# Altium footprint library 6-Connectors-6.PcbLib: 117 footprints (part 1 of 8) (continued)
## 3M_2540-6002RB [mm] "40 Contacts - Straight .100\" x .100\" Low Profile Four-Wall Header"
height 10.03
pads (40):
  round 1.6 hole 1: 1(-24.13,-1.27) 2(-24.13,1.27) 3(-21.59,-1.27) 4(-21.59,1.27) 5(-19.05,-1.27) 6(-19.05,1.27) 7(-16.51,-1.27) 8(-16.51,1.27) 9(-13.97,-1.27) 10(-13.97,1.27) 11(-11.43,-1.27) 12(-11.43,1.27) 13(-8.89,-1.27) 14(-8.89,1.27) 15(-6.35,-1.27) 16(-6.35,1.27) 17(-3.81,-1.27) 18(-3.81,1.27) 19(-1.27,-1.27) 20(-1.27,1.27) 21(1.27,-1.27) 22(1.27,1.27) 23(3.81,-1.27) 24(3.81,1.27) 25(6.35,-1.27) 26(6.35,1.27) 27(8.89,-1.27) 28(8.89,1.27) 29(11.43,-1.27) 30(11.43,1.27) 31(13.97,-1.27) 32(13.97,1.27) 33(16.51,-1.27) 34(16.51,1.27) 35(19.05,-1.27) 36(19.05,1.27) 37(21.59,-1.27) 38(21.59,1.27) 39(24.13,-1.27) 40(24.13,1.27)
Top Overlay:
  circle w0.3: c-24.13,-4.699 r0.15
  lines w0.2: -28.042,-1.603 -25.629,-1.603 -25.629,1.603 -28.042,1.603 ; -28.042,-1.524 -28.346,-1.524 -28.346,1.524 -28.042,1.524 ; -24.994,-4.064 -24.13,-3.2 -23.266,-4.064 ; -23.178,3.15 -28.042,3.15 -28.042,-3.2 -3.366,-3.2 ; -23.178,4.064 -23.178,2.159 -22.469,2.159 ; -21.361,-3.835 -21.361,-3.2 ; -19.279,-3.835 -19.279,-3.2 ; -18.987,2.518 -18.987,4.064 ; -18.987,3.15 18.987,3.15 ; -3.366,-4.064 -3.366,-2.438 ; 0.826,-4.064 0.826,-2.438 ; 0.826,-3.2 28.042,-3.2 28.042,3.15 25.4,3.15 ; 18.987,2.518 18.987,4.064 ; 21.819,-3.835 21.819,-3.2 ; 22.469,2.159 23.178,2.159 23.178,4.064 ; 23.901,-3.835 23.901,-3.2 ; 28.042,-1.603 25.629,-1.603 25.629,1.603 28.042,1.603 ; 28.042,-1.524 28.346,-1.524 28.346,1.524 28.042,1.524 ; -29.058,-4.064 -22.352,-4.064 -22.352,-3.835 -18.288,-3.835 -18.288,-4.064 20.828,-4.064 20.828,-3.835 24.892,-3.835 24.892,-4.064 29.058,-4.064 29.058,4.064 28.397,4.064 ccw(c27.94,4.064) 27.483,4.064 -0.813,4.064 ccw(c-1.27,4.064) -1.727,4.064 -27.483,4.064 ccw(c-27.94,4.064) -28.397,4.064 -29.058,4.064 -29.058,-4.064
  text "40" at 23.495,2.667 h1.02
Mechanical 14:
  lines w0.1: -28.042,-1.603 -25.629,-1.603 -25.629,1.603 -28.042,1.603 ; -28.042,-1.524 -28.346,-1.524 -28.346,1.524 -28.042,1.524 ; -24.994,-4.064 -24.13,-3.2 -23.266,-4.064 ; -23.178,3.15 -28.042,3.15 -28.042,-3.2 -3.366,-3.2 ; -23.178,4.064 -23.178,2.159 -18.987,2.159 -18.987,4.064 ; -21.361,-3.835 -21.361,-3.2 ; -19.279,-3.835 -19.279,-3.2 ; -18.987,3.15 18.987,3.15 ; -3.366,-4.064 -3.366,-2.159 0.826,-2.159 0.826,-4.064 ; 0.826,-3.2 28.042,-3.2 28.042,3.15 25.4,3.15 ; 18.987,4.064 18.987,2.159 23.178,2.159 23.178,4.064 ; 21.819,-3.835 21.819,-3.2 ; 23.901,-3.835 23.901,-3.2 ; 28.042,-1.603 25.629,-1.603 25.629,1.603 28.042,1.603 ; 28.042,-1.524 28.346,-1.524 28.346,1.524 28.042,1.524 ; -29.058,-4.064 -22.352,-4.064 -22.352,-3.835 -18.288,-3.835 -18.288,-4.064 20.828,-4.064 20.828,-3.835 24.892,-3.835 24.892,-4.064 29.058,-4.064 29.058,4.064 28.397,4.064 ccw(c27.94,4.064) 27.483,4.064 -0.813,4.064 ccw(c-1.27,4.064) -1.727,4.064 -27.483,4.064 ccw(c-27.94,4.064) -28.397,4.064 -29.058,4.064 -29.058,-4.064
  text "40" at 23.495,2.667 h1.02
3D body "3M_2540-6002RB.stp": height 9.65, standoff -2.59, extent -29.058,-4.064 29.058,4.572

## 3M_2550-6002RB [mm] "50 Contacts - Straight .100\" x .100\" Low Profile Four-Wall Header"
height 10.03
pads (50):
  round 1.6 hole 1: 1(-30.48,-1.27) 2(-30.48,1.27) 3(-27.94,-1.27) 4(-27.94,1.27) 5(-25.4,-1.27) 6(-25.4,1.27) 7(-22.86,-1.27) 8(-22.86,1.27) 9(-20.32,-1.27) 10(-20.32,1.27) 11(-17.78,-1.27) 12(-17.78,1.27) 13(-15.24,-1.27) 14(-15.24,1.27) 15(-12.7,-1.27) 16(-12.7,1.27) 17(-10.16,-1.27) 18(-10.16,1.27) 19(-7.62,-1.27) 20(-7.62,1.27) 21(-5.08,-1.27) 22(-5.08,1.27) 23(-2.54,-1.27) 24(-2.54,1.27) 25(0,-1.27) 26(0,1.27) 27(2.54,-1.27) 28(2.54,1.27) 29(5.08,-1.27) 30(5.08,1.27) 31(7.62,-1.27) 32(7.62,1.27) 33(10.16,-1.27) 34(10.16,1.27) 35(12.7,-1.27) 36(12.7,1.27) 37(15.24,-1.27) 38(15.24,1.27) 39(17.78,-1.27) 40(17.78,1.27) 41(20.32,-1.27) 42(20.32,1.27) 43(22.86,-1.27) 44(22.86,1.27) 45(25.4,-1.27) 46(25.4,1.27) 47(27.94,-1.27) 48(27.94,1.27) 49(30.48,-1.27) 50(30.48,1.27)
Top Overlay:
  circle w0.3: c-30.48,-4.699 r0.15
  lines w0.2: -34.392,-1.603 -31.979,-1.603 -31.979,1.603 -34.392,1.603 ; -34.392,-1.524 -34.696,-1.524 -34.696,1.524 -34.392,1.524 ; -31.344,-4.064 -30.48,-3.2 -29.616,-4.064 ; -29.528,3.15 -34.392,3.15 -34.392,-3.2 -2.096,-3.2 ; -29.528,4.064 -29.528,2.159 -28.819,2.159 ; -27.711,-3.835 -27.711,-3.2 ; -25.629,-3.835 -25.629,-3.2 ; -25.337,2.518 -25.337,4.064 ; -25.337,3.15 25.337,3.15 ; -2.096,-4.064 -2.096,-2.438 ; 2.095,-4.064 2.095,-2.438 ; 2.095,-3.2 34.392,-3.2 34.392,3.15 31.75,3.15 ; 25.337,2.518 25.337,4.064 ; 28.169,-3.835 28.169,-3.2 ; 28.819,2.159 29.528,2.159 29.528,4.064 ; 30.251,-3.835 30.251,-3.2 ; 34.392,-1.603 31.979,-1.603 31.979,1.603 34.392,1.603 ; 34.392,-1.524 34.696,-1.524 34.696,1.524 34.392,1.524 ; -35.408,-4.064 -35.408,4.064 -34.747,4.064 cw(c-34.29,4.064) -33.833,4.064 -0.457,4.064 cw(c0,4.064) 0.457,4.064 33.833,4.064 cw(c34.29,4.064) 34.747,4.064 35.408,4.064 35.408,-4.064 31.242,-4.064 31.242,-3.835 27.178,-3.835 27.178,-4.064 -24.638,-4.064 -24.638,-3.835 -28.702,-3.835 -28.702,-4.064 -35.408,-4.064
  text "50" at 29.845,2.667 h1.02
Mechanical 14:
  lines w0.1: -34.392,-1.603 -31.979,-1.603 -31.979,1.603 -34.392,1.603 ; -34.392,-1.524 -34.696,-1.524 -34.696,1.524 -34.392,1.524 ; -31.344,-4.064 -30.48,-3.2 -29.616,-4.064 ; -29.528,3.15 -34.392,3.15 -34.392,-3.2 -2.096,-3.2 ; -29.528,4.064 -29.528,2.159 -25.337,2.159 -25.337,4.064 ; -27.711,-3.835 -27.711,-3.2 ; -25.629,-3.835 -25.629,-3.2 ; -25.337,3.15 25.337,3.15 ; -2.096,-4.064 -2.096,-2.159 2.095,-2.159 2.095,-4.064 ; 2.095,-3.2 34.392,-3.2 34.392,3.15 31.75,3.15 ; 25.337,4.064 25.337,2.159 29.528,2.159 29.528,4.064 ; 28.169,-3.835 28.169,-3.2 ; 30.251,-3.835 30.251,-3.2 ; 34.392,-1.603 31.979,-1.603 31.979,1.603 34.392,1.603 ; 34.392,-1.524 34.696,-1.524 34.696,1.524 34.392,1.524 ; -35.408,-4.064 -35.408,4.064 -34.747,4.064 cw(c-34.29,4.064) -33.833,4.064 -0.457,4.064 cw(c0,4.064) 0.457,4.064 33.833,4.064 cw(c34.29,4.064) 34.747,4.064 35.408,4.064 35.408,-4.064 31.242,-4.064 31.242,-3.835 27.178,-3.835 27.178,-4.064 -24.638,-4.064 -24.638,-3.835 -28.702,-3.835 -28.702,-4.064 -35.408,-4.064
  text "50" at 29.845,2.667 h1.02
3D body "3M_2550-6002RB.stp": height 9.65, standoff -2.59, extent -35.408,-4.064 35.408,4.572

## 3M_2560-6002RB [mm] "60 Contacts - Straight .100\" x .100\" Low Profile Four-Wall Header"
height 10.03
pads (60):
  round 1.6 hole 1: 1(-36.83,-1.27) 2(-36.83,1.27) 3(-34.29,-1.27) 4(-34.29,1.27) 5(-31.75,-1.27) 6(-31.75,1.27) 7(-29.21,-1.27) 8(-29.21,1.27) 9(-26.67,-1.27) 10(-26.67,1.27) 11(-24.13,-1.27) 12(-24.13,1.27) 13(-21.59,-1.27) 14(-21.59,1.27) 15(-19.05,-1.27) 16(-19.05,1.27) 17(-16.51,-1.27) 18(-16.51,1.27) 19(-13.97,-1.27) 20(-13.97,1.27) 21(-11.43,-1.27) 22(-11.43,1.27) 23(-8.89,-1.27) 24(-8.89,1.27) 25(-6.35,-1.27) 26(-6.35,1.27) 27(-3.81,-1.27) 28(-3.81,1.27) 29(-1.27,-1.27) 30(-1.27,1.27) 31(1.27,-1.27) 32(1.27,1.27) 33(3.81,-1.27) 34(3.81,1.27) 35(6.35,-1.27) 36(6.35,1.27) 37(8.89,-1.27) 38(8.89,1.27) 39(11.43,-1.27) 40(11.43,1.27) 41(13.97,-1.27) 42(13.97,1.27) 43(16.51,-1.27) 44(16.51,1.27) 45(19.05,-1.27) 46(19.05,1.27) 47(21.59,-1.27) 48(21.59,1.27) 49(24.13,-1.27) 50(24.13,1.27) 51(26.67,-1.27) 52(26.67,1.27) 53(29.21,-1.27) 54(29.21,1.27) 55(31.75,-1.27) 56(31.75,1.27) 57(34.29,-1.27) 58(34.29,1.27) 59(36.83,-1.27) 60(36.83,1.27)
Top Overlay:
  circle w0.3: c-36.83,-4.699 r0.15
  lines w0.2: -40.742,-1.603 -38.329,-1.603 -38.329,1.603 -40.742,1.603 ; -40.742,-1.524 -41.046,-1.524 -41.046,1.524 -40.742,1.524 ; -37.694,-4.064 -36.83,-3.2 -35.966,-4.064 ; -35.878,3.15 -40.742,3.15 -40.742,-3.2 -3.366,-3.2 ; -35.878,4.064 -35.878,2.159 -35.169,2.159 ; -34.061,-3.835 -34.061,-3.2 ; -31.979,-3.835 -31.979,-3.2 ; -31.687,2.518 -31.687,4.064 ; -31.687,3.15 31.687,3.15 ; -3.366,-4.064 -3.366,-2.438 ; 0.826,-4.064 0.826,-2.438 ; 0.826,-3.2 40.742,-3.2 40.742,3.15 38.1,3.15 ; 31.687,2.518 31.687,4.064 ; 34.519,-3.835 34.519,-3.2 ; 35.169,2.159 35.878,2.159 35.878,4.064 ; 36.601,-3.835 36.601,-3.2 ; 40.742,-1.603 38.329,-1.603 38.329,1.603 40.742,1.603 ; 40.742,-1.524 41.046,-1.524 41.046,1.524 40.742,1.524 ; -41.758,-4.064 -35.052,-4.064 -35.052,-3.835 -30.988,-3.835 -30.988,-4.064 33.528,-4.064 33.528,-3.835 37.592,-3.835 37.592,-4.064 41.758,-4.064 41.758,4.064 41.097,4.064 ccw(c40.64,4.064) 40.183,4.064 -0.813,4.064 ccw(c-1.27,4.064) -1.727,4.064 -40.183,4.064 ccw(c-40.64,4.064) -41.097,4.064 -41.758,4.064 -41.758,-4.064
  text "60" at 36.195,2.667 h1.02
Mechanical 14:
  lines w0.1: -40.742,-1.603 -38.329,-1.603 -38.329,1.603 -40.742,1.603 ; -40.742,-1.524 -41.046,-1.524 -41.046,1.524 -40.742,1.524 ; -37.694,-4.064 -36.83,-3.2 -35.966,-4.064 ; -35.878,3.15 -40.742,3.15 -40.742,-3.2 -3.366,-3.2 ; -35.878,4.064 -35.878,2.159 -31.687,2.159 -31.687,4.064 ; -34.061,-3.835 -34.061,-3.2 ; -31.979,-3.835 -31.979,-3.2 ; -31.687,3.15 31.687,3.15 ; -3.366,-4.064 -3.366,-2.159 0.826,-2.159 0.826,-4.064 ; 0.826,-3.2 40.742,-3.2 40.742,3.15 38.1,3.15 ; 31.687,4.064 31.687,2.159 35.878,2.159 35.878,4.064 ; 34.519,-3.835 34.519,-3.2 ; 36.601,-3.835 36.601,-3.2 ; 40.742,-1.603 38.329,-1.603 38.329,1.603 40.742,1.603 ; 40.742,-1.524 41.046,-1.524 41.046,1.524 40.742,1.524 ; -41.758,-4.064 -35.052,-4.064 -35.052,-3.835 -30.988,-3.835 -30.988,-4.064 33.528,-4.064 33.528,-3.835 37.592,-3.835 37.592,-4.064 41.758,-4.064 41.758,4.064 41.097,4.064 ccw(c40.64,4.064) 40.183,4.064 -0.813,4.064 ccw(c-1.27,4.064) -1.727,4.064 -40.183,4.064 ccw(c-40.64,4.064) -41.097,4.064 -41.758,4.064 -41.758,-4.064
  text "60" at 36.195,2.667 h1.02
3D body "3M_2560-6002RB.stp": height 9.65, standoff -2.59, extent -41.758,-4.064 41.758,4.572

## 3M_2564-6002RB [mm] "64 Contacts - Straight .100\" x .100\" Low Profile Four-Wall Header"
height 10.03
pads (64):
  round 1.6 hole 1: 1(-39.37,-1.27) 2(-39.37,1.27) 3(-36.83,-1.27) 4(-36.83,1.27) 5(-34.29,-1.27) 6(-34.29,1.27) 7(-31.75,-1.27) 8(-31.75,1.27) 9(-29.21,-1.27) 10(-29.21,1.27) 11(-26.67,-1.27) 12(-26.67,1.27) 13(-24.13,-1.27) 14(-24.13,1.27) 15(-21.59,-1.27) 16(-21.59,1.27) 17(-19.05,-1.27) 18(-19.05,1.27) 19(-16.51,-1.27) 20(-16.51,1.27) 21(-13.97,-1.27) 22(-13.97,1.27) 23(-11.43,-1.27) 24(-11.43,1.27) 25(-8.89,-1.27) 26(-8.89,1.27) 27(-6.35,-1.27) 28(-6.35,1.27) 29(-3.81,-1.27) 30(-3.81,1.27) 31(-1.27,-1.27) 32(-1.27,1.27) 33(1.27,-1.27) 34(1.27,1.27) 35(3.81,-1.27) 36(3.81,1.27) 37(6.35,-1.27) 38(6.35,1.27) 39(8.89,-1.27) 40(8.89,1.27) 41(11.43,-1.27) 42(11.43,1.27) 43(13.97,-1.27) 44(13.97,1.27) 45(16.51,-1.27) 46(16.51,1.27) 47(19.05,-1.27) 48(19.05,1.27) 49(21.59,-1.27) 50(21.59,1.27) 51(24.13,-1.27) 52(24.13,1.27) 53(26.67,-1.27) 54(26.67,1.27) 55(29.21,-1.27) 56(29.21,1.27) 57(31.75,-1.27) 58(31.75,1.27) 59(34.29,-1.27) 60(34.29,1.27) 61(36.83,-1.27) 62(36.83,1.27) 63(39.37,-1.27) 64(39.37,1.27)
Top Overlay:
  circle w0.3: c-39.37,-4.699 r0.15
  lines w0.2: -43.282,-1.603 -40.869,-1.603 -40.869,1.603 -43.282,1.603 ; -43.282,-1.524 -43.586,-1.524 -43.586,1.524 -43.282,1.524 ; -40.234,-4.064 -39.37,-3.2 -38.506,-4.064 ; -38.418,3.15 -43.282,3.15 -43.282,-3.2 -3.366,-3.2 ; -38.418,4.064 -38.418,2.159 -37.709,2.159 ; -36.601,-3.835 -36.601,-3.2 ; -34.519,-3.835 -34.519,-3.2 ; -34.227,2.518 -34.227,4.064 ; -34.227,3.15 34.227,3.15 ; -3.366,-4.064 -3.366,-2.438 ; 0.826,-4.064 0.826,-2.438 ; 0.826,-3.2 43.282,-3.2 43.282,3.15 40.64,3.15 ; 34.227,2.518 34.227,4.064 ; 37.059,-3.835 37.059,-3.2 ; 37.709,2.159 38.418,2.159 38.418,4.064 ; 39.141,-3.835 39.141,-3.2 ; 43.282,-1.603 40.869,-1.603 40.869,1.603 43.282,1.603 ; 43.282,-1.524 43.586,-1.524 43.586,1.524 43.282,1.524 ; -44.298,-4.064 -37.592,-4.064 -37.592,-3.835 -33.528,-3.835 -33.528,-4.064 36.068,-4.064 36.068,-3.835 40.132,-3.835 40.132,-4.064 44.298,-4.064 44.298,4.064 43.637,4.064 ccw(c43.18,4.064) 42.723,4.064 -0.813,4.064 ccw(c-1.27,4.064) -1.727,4.064 -42.723,4.064 ccw(c-43.18,4.064) -43.637,4.064 -44.298,4.064 -44.298,-4.064
  text "64" at 38.735,2.667 h1.02
Mechanical 14:
  lines w0.1: -43.282,-1.603 -40.869,-1.603 -40.869,1.603 -43.282,1.603 ; -43.282,-1.524 -43.586,-1.524 -43.586,1.524 -43.282,1.524 ; -40.234,-4.064 -39.37,-3.2 -38.506,-4.064 ; -38.418,3.15 -43.282,3.15 -43.282,-3.2 -3.366,-3.2 ; -38.418,4.064 -38.418,2.159 -34.227,2.159 -34.227,4.064 ; -36.601,-3.835 -36.601,-3.2 ; -34.519,-3.835 -34.519,-3.2 ; -34.227,3.15 34.227,3.15 ; -3.366,-4.064 -3.366,-2.159 0.826,-2.159 0.826,-4.064 ; 0.826,-3.2 43.282,-3.2 43.282,3.15 40.64,3.15 ; 34.227,4.064 34.227,2.159 38.418,2.159 38.418,4.064 ; 37.059,-3.835 37.059,-3.2 ; 39.141,-3.835 39.141,-3.2 ; 43.282,-1.603 40.869,-1.603 40.869,1.603 43.282,1.603 ; 43.282,-1.524 43.586,-1.524 43.586,1.524 43.282,1.524 ; -44.298,-4.064 -37.592,-4.064 -37.592,-3.835 -33.528,-3.835 -33.528,-4.064 36.068,-4.064 36.068,-3.835 40.132,-3.835 40.132,-4.064 44.298,-4.064 44.298,4.064 43.637,4.064 ccw(c43.18,4.064) 42.723,4.064 -0.813,4.064 ccw(c-1.27,4.064) -1.727,4.064 -42.723,4.064 ccw(c-43.18,4.064) -43.637,4.064 -44.298,4.064 -44.298,-4.064
  text "64" at 38.735,2.667 h1.02
3D body "3M_2564-6002RB.stp": height 9.65, standoff -2.59, extent -44.298,-4.064 44.298,4.572

## 3M_9120-4500PL [mm] "20 Contacts - Straight .100\" x .100\" Polarized Boardmount Socket, 9100 Series"
height 9
pads (20):
  round 1.6 hole 0.9: 1(11.43,-1.27) 2(11.43,1.27) 3(8.89,-1.27) 4(8.89,1.27) 5(6.35,-1.27) 6(6.35,1.27) 7(3.81,-1.27) 8(3.81,1.27) 9(1.27,-1.27) 10(1.27,1.27) 11(-1.27,-1.27) 12(-1.27,1.27) 13(-3.81,-1.27) 14(-3.81,1.27) 15(-6.35,-1.27) 16(-6.35,1.27) 17(-8.89,-1.27) 18(-8.89,1.27) 19(-11.43,-1.27) 20(-11.43,1.27)
Top Overlay:
  circle w0.3: c11.43,-3.556 r0.15
  lines w0.2: -1.7,-3.05 -1.7,-4.05 1.7,-4.05 1.7,-3.05 ; -14.95,-2.05 ccw(c-13.95,-2.05) -13.95,-3.05 13.95,-3.05 ccw(c13.95,-2.05) 14.95,-2.05 14.95,-1.27 13.95,-1.27 13.95,1.27 14.95,1.27 14.95,2.05 ccw(c13.95,2.05) 13.95,3.05 -13.95,3.05 ccw(c-13.95,2.05) -14.95,2.05 -14.95,1.27 -13.95,1.27 -13.95,-1.27 -14.95,-1.27 -14.95,-2.05 ; 10.566,-3.05 12.294,-3.05 11.43,-2.186 10.566,-3.05
Mechanical 8:
  lines w0.1: -12.43,-1.27 -11.43,-1.27 ; -12.43,1.27 -11.43,1.27 ; -11.43,-2.27 -11.43,-1.27 ; -11.43,-0.27 -11.43,-1.27 ; -11.43,0.27 -11.43,1.27 ; -11.43,2.27 -11.43,1.27 ; -10.43,-1.27 -11.43,-1.27 ; -10.43,1.27 -11.43,1.27 ; -9.89,-1.27 -8.89,-1.27 ; -9.89,1.27 -8.89,1.27 ; -8.89,-2.27 -8.89,-1.27 ; -8.89,-0.27 -8.89,-1.27 ; -8.89,0.27 -8.89,1.27 ; -8.89,2.27 -8.89,1.27 ; -7.89,-1.27 -8.89,-1.27 ; -7.89,1.27 -8.89,1.27 ; -7.35,-1.27 -6.35,-1.27 ; -7.35,1.27 -6.35,1.27 ; -6.35,-2.27 -6.35,-1.27 ; -6.35,-0.27 -6.35,-1.27 ; -6.35,0.27 -6.35,1.27 ; -6.35,2.27 -6.35,1.27 ; -5.35,-1.27 -6.35,-1.27 ; -5.35,1.27 -6.35,1.27 ; -4.81,-1.27 -3.81,-1.27 ; -4.81,1.27 -3.81,1.27 ; -3.81,-2.27 -3.81,-1.27 ; -3.81,-0.27 -3.81,-1.27 ; -3.81,0.27 -3.81,1.27 ; -3.81,2.27 -3.81,1.27 ; -2.81,-1.27 -3.81,-1.27 ; -2.81,1.27 -3.81,1.27 ; -2.27,-1.27 -1.27,-1.27 ; -2.27,1.27 -1.27,1.27 ; -1.27,-2.27 -1.27,-1.27 ; -1.27,-0.27 -1.27,-1.27 ; -1.27,0.27 -1.27,1.27 ; -1.27,2.27 -1.27,1.27 ; -1,0 0,0 ; -0.27,-1.27 -1.27,-1.27 ; -0.27,1.27 -1.27,1.27 ; 0,-1 0,0 ; 0,1 0,0 ; 0.27,-1.27 1.27,-1.27 ; 0.27,1.27 1.27,1.27 ; 1,0 0,0 ; 1.27,-2.27 1.27,-1.27 ; 1.27,-0.27 1.27,-1.27 ; 1.27,0.27 1.27,1.27 ; 1.27,2.27 1.27,1.27 ; 2.27,-1.27 1.27,-1.27 ; 2.27,1.27 1.27,1.27 ; 2.81,-1.27 3.81,-1.27 ; 2.81,1.27 3.81,1.27 ; 3.81,-2.27 3.81,-1.27 ; 3.81,-0.27 3.81,-1.27 ; 3.81,0.27 3.81,1.27 ; 3.81,2.27 3.81,1.27 ; 4.81,-1.27 3.81,-1.27 ; 4.81,1.27 3.81,1.27 ; 5.35,-1.27 6.35,-1.27 ; 5.35,1.27 6.35,1.27 ; 6.35,-2.27 6.35,-1.27 ; 6.35,-0.27 6.35,-1.27 ; 6.35,0.27 6.35,1.27 ; 6.35,2.27 6.35,1.27 ; 7.35,-1.27 6.35,-1.27 ; 7.35,1.27 6.35,1.27 ; 7.89,-1.27 8.89,-1.27 ; 7.89,1.27 8.89,1.27 ; 8.89,-2.27 8.89,-1.27 ; 8.89,-0.27 8.89,-1.27 ; 8.89,0.27 8.89,1.27 ; 8.89,2.27 8.89,1.27 ; 9.89,-1.27 8.89,-1.27 ; 9.89,1.27 8.89,1.27 ; 10.43,-1.27 11.43,-1.27 ; 10.43,1.27 11.43,1.27 ; 11.43,-2.27 11.43,-1.27 ; 11.43,-0.27 11.43,-1.27 ; 11.43,0.27 11.43,1.27 ; 11.43,2.27 11.43,1.27 ; 12.43,-1.27 11.43,-1.27 ; 12.43,1.27 11.43,1.27
Mechanical 14:
  circle w0.3: c11.43,-3.556 r0.15
  lines w0.1: 10.566,-3.05 11.43,-2.186 12.294,-3.05 ; -14.95,-2.05 ccw(c-13.95,-2.05) -13.95,-3.05 13.95,-3.05 ccw(c13.95,-2.05) 14.95,-2.05 14.95,-1.27 13.95,-1.27 13.95,1.27 14.95,1.27 14.95,2.05 ccw(c13.95,2.05) 13.95,3.05 -13.95,3.05 ccw(c-13.95,2.05) -14.95,2.05 -14.95,1.27 -13.95,1.27 -13.95,-1.27 -14.95,-1.27 ; -14.95,-2.05 -14.95,-1.27 ; -14.95,-2.05 -14.95,-1.27 ; -1.7,-4.05 1.7,-4.05 1.7,-3.05 -1.7,-3.05 -1.7,-4.05
3D body "3M_9120-4500PL.stp": height 9, standoff -2.8, extent -14.95,-4.05 14.95,3.05

## 3M_9126-4500PL [mm] "26 Contacts - Straight .100\" x .100\" Polarized Boardmount Socket, 9100 Series"
height 9
pads (26):
  round 1.6 hole 0.9: 1(15.24,-1.27) 2(15.24,1.27) 3(12.7,-1.27) 4(12.7,1.27) 5(10.16,-1.27) 6(10.16,1.27) 7(7.62,-1.27) 8(7.62,1.27) 9(5.08,-1.27) 10(5.08,1.27) 11(2.54,-1.27) 12(2.54,1.27) 13(0,-1.27) 14(0,1.27) 15(-2.54,-1.27) 16(-2.54,1.27) 17(-5.08,-1.27) 18(-5.08,1.27) 19(-7.62,-1.27) 20(-7.62,1.27) 21(-10.16,-1.27) 22(-10.16,1.27) 23(-12.7,-1.27) 24(-12.7,1.27) 25(-15.24,-1.27) 26(-15.24,1.27)
Top Overlay:
  lines w0.2: -1.7,-3.05 -1.7,-4.05 1.7,-4.05 1.7,-3.05 ; -18.76,-2.05 ccw(c-17.76,-2.05) -17.76,-3.05 17.74,-3.05 ccw(c17.74,-2.05) 18.74,-2.05 18.74,-1.27 17.74,-1.27 17.74,1.27 18.74,1.27 18.74,2.05 ccw(c17.74,2.05) 17.74,3.05 -17.76,3.05 ccw(c-17.76,2.05) -18.76,2.05 -18.76,1.27 -17.76,1.27 -17.76,-1.27 -18.76,-1.27 ; -18.76,-2.05 -18.76,-1.27 ; -18.76,-2.05 -18.76,-1.27
Mechanical 8:
  lines w0.1: -16.24,-1.27 -15.24,-1.27 ; -16.24,1.27 -15.24,1.27 ; -15.24,-2.27 -15.24,-1.27 ; -15.24,-0.27 -15.24,-1.27 ; -15.24,0.27 -15.24,1.27 ; -15.24,2.27 -15.24,1.27 ; -14.24,-1.27 -15.24,-1.27 ; -14.24,1.27 -15.24,1.27 ; -13.7,-1.27 -12.7,-1.27 ; -13.7,1.27 -12.7,1.27 ; -12.7,-2.27 -12.7,-1.27 ; -12.7,-0.27 -12.7,-1.27 ; -12.7,0.27 -12.7,1.27 ; -12.7,2.27 -12.7,1.27 ; -11.7,-1.27 -12.7,-1.27 ; -11.7,1.27 -12.7,1.27 ; -11.16,-1.27 -10.16,-1.27 ; -11.16,1.27 -10.16,1.27 ; -10.16,-2.27 -10.16,-1.27 ; -10.16,-0.27 -10.16,-1.27 ; -10.16,0.27 -10.16,1.27 ; -10.16,2.27 -10.16,1.27 ; -9.16,-1.27 -10.16,-1.27 ; -9.16,1.27 -10.16,1.27 ; -8.62,-1.27 -7.62,-1.27 ; -8.62,1.27 -7.62,1.27 ; -7.62,-2.27 -7.62,-1.27 ; -7.62,-0.27 -7.62,-1.27 ; -7.62,0.27 -7.62,1.27 ; -7.62,2.27 -7.62,1.27 ; -6.62,-1.27 -7.62,-1.27 ; -6.62,1.27 -7.62,1.27 ; -6.08,-1.27 -5.08,-1.27 ; -6.08,1.27 -5.08,1.27 ; -5.08,-2.27 -5.08,-1.27 ; -5.08,-0.27 -5.08,-1.27 ; -5.08,0.27 -5.08,1.27 ; -5.08,2.27 -5.08,1.27 ; -4.08,-1.27 -5.08,-1.27 ; -4.08,1.27 -5.08,1.27 ; -3.54,-1.27 -2.54,-1.27 ; -3.54,1.27 -2.54,1.27 ; -2.54,-2.27 -2.54,-1.27 ; -2.54,-0.27 -2.54,-1.27 ; -2.54,0.27 -2.54,1.27 ; -2.54,2.27 -2.54,1.27 ; -1.54,-1.27 -2.54,-1.27 ; -1.54,1.27 -2.54,1.27 ; -1,-1.27 0,-1.27 ; -1,0 0,0 ; -1,1.27 0,1.27 ; 0,-2.27 0,-1.27 ; 0,-1 0,0 ; 0,-0.27 0,-1.27 ; 0,0.27 0,1.27 ; 0,1 0,0 ; 0,2.27 0,1.27 ; 1,-1.27 0,-1.27 ; 1,0 0,0 ; 1,1.27 0,1.27 ; 1.54,-1.27 2.54,-1.27 ; 1.54,1.27 2.54,1.27 ; 2.54,-2.27 2.54,-1.27 ; 2.54,-0.27 2.54,-1.27 ; 2.54,0.27 2.54,1.27 ; 2.54,2.27 2.54,1.27 ; 3.54,-1.27 2.54,-1.27 ; 3.54,1.27 2.54,1.27 ; 4.08,-1.27 5.08,-1.27 ; 4.08,1.27 5.08,1.27 ; 5.08,-2.27 5.08,-1.27 ; 5.08,-0.27 5.08,-1.27 ; 5.08,0.27 5.08,1.27 ; 5.08,2.27 5.08,1.27 ; 6.08,-1.27 5.08,-1.27 ; 6.08,1.27 5.08,1.27 ; 6.62,-1.27 7.62,-1.27 ; 6.62,1.27 7.62,1.27 ; 7.62,-2.27 7.62,-1.27 ; 7.62,-0.27 7.62,-1.27 ; 7.62,0.27 7.62,1.27 ; 7.62,2.27 7.62,1.27 ; 8.62,-1.27 7.62,-1.27 ; 8.62,1.27 7.62,1.27 ; 9.16,-1.27 10.16,-1.27 ; 9.16,1.27 10.16,1.27 ; 10.16,-2.27 10.16,-1.27 ; 10.16,-0.27 10.16,-1.27 ; 10.16,0.27 10.16,1.27 ; 10.16,2.27 10.16,1.27 ; 11.16,-1.27 10.16,-1.27 ; 11.16,1.27 10.16,1.27 ; 11.7,-1.27 12.7,-1.27 ; 11.7,1.27 12.7,1.27 ; 12.7,-2.27 12.7,-1.27 ; 12.7,-0.27 12.7,-1.27 ; 12.7,0.27 12.7,1.27 ; 12.7,2.27 12.7,1.27 ; 13.7,-1.27 12.7,-1.27 ; 13.7,1.27 12.7,1.27 ; 14.24,-1.27 15.24,-1.27 ; 14.24,1.27 15.24,1.27 ; 15.24,-2.27 15.24,-1.27 ; 15.24,-0.27 15.24,-1.27 ; 15.24,0.27 15.24,1.27 ; 15.24,2.27 15.24,1.27 ; 16.24,-1.27 15.24,-1.27 ; 16.24,1.27 15.24,1.27
Mechanical 14:
  lines w0.1: -1.7,-3.05 -1.7,-4.05 1.7,-4.05 1.7,-3.05 ; -18.76,-2.05 ccw(c-17.76,-2.05) -17.76,-3.05 17.74,-3.05 ccw(c17.74,-2.05) 18.74,-2.05 18.74,-1.27 17.74,-1.27 17.74,1.27 18.74,1.27 18.74,2.05 ccw(c17.74,2.05) 17.74,3.05 -17.76,3.05 ccw(c-17.76,2.05) -18.76,2.05 -18.76,1.27 -17.76,1.27 -17.76,-1.27 -18.76,-1.27 ; -18.76,-2.05 -18.76,-1.27 ; -18.76,-2.05 -18.76,-1.27
3D body "3M_9126-4500PL.stp": height 9, standoff -2.8, extent -18.76,-4.05 18.74,3.05

## 3M_9134-4500PL [mm] "34 Contacts - Straight .100\" x .100\" Polarized Boardmount Socket, 9100 Series"
height 9
pads (34):
  round 1.6 hole 0.9: 1(20.32,-1.27) 2(20.32,1.27) 3(17.78,-1.27) 4(17.78,1.27) 5(15.24,-1.27) 6(15.24,1.27) 7(12.7,-1.27) 8(12.7,1.27) 9(10.16,-1.27) 10(10.16,1.27) 11(7.62,-1.27) 12(7.62,1.27) 13(5.08,-1.27) 14(5.08,1.27) 15(2.54,-1.27) 16(2.54,1.27) 17(0,-1.27) 18(0,1.27) 19(-2.54,-1.27) 20(-2.54,1.27) 21(-5.08,-1.27) 22(-5.08,1.27) 23(-7.62,-1.27) 24(-7.62,1.27) 25(-10.16,-1.27) 26(-10.16,1.27) 27(-12.7,-1.27) 28(-12.7,1.27) 29(-15.24,-1.27) 30(-15.24,1.27) 31(-17.78,-1.27) 32(-17.78,1.27) 33(-20.32,-1.27) 34(-20.32,1.27)
Top Overlay:
  lines w0.2: -1.7,-3.05 -1.7,-4.05 1.7,-4.05 1.7,-3.05 ; -23.86,-2.05 ccw(c-22.86,-2.05) -22.86,-3.05 22.84,-3.05 ccw(c22.84,-2.05) 23.84,-2.05 23.84,-1.27 22.84,-1.27 22.84,1.27 23.84,1.27 23.84,2.05 ccw(c22.84,2.05) 22.84,3.05 -22.86,3.05 ccw(c-22.86,2.05) -23.86,2.05 -23.86,1.27 -22.86,1.27 -22.86,-1.27 -23.86,-1.27 ; -23.86,-2.05 -23.86,-1.27 ; -23.86,-2.05 -23.86,-1.27
Mechanical 8:
  lines w0.1: -21.32,-1.27 -20.32,-1.27 ; -21.32,1.27 -20.32,1.27 ; -20.32,-2.27 -20.32,-1.27 ; -20.32,-0.27 -20.32,-1.27 ; -20.32,0.27 -20.32,1.27 ; -20.32,2.27 -20.32,1.27 ; -19.32,-1.27 -20.32,-1.27 ; -19.32,1.27 -20.32,1.27 ; -18.78,-1.27 -17.78,-1.27 ; -18.78,1.27 -17.78,1.27 ; -17.78,-2.27 -17.78,-1.27 ; -17.78,-0.27 -17.78,-1.27 ; -17.78,0.27 -17.78,1.27 ; -17.78,2.27 -17.78,1.27 ; -16.78,-1.27 -17.78,-1.27 ; -16.78,1.27 -17.78,1.27 ; -16.24,-1.27 -15.24,-1.27 ; -16.24,1.27 -15.24,1.27 ; -15.24,-2.27 -15.24,-1.27 ; -15.24,-0.27 -15.24,-1.27 ; -15.24,0.27 -15.24,1.27 ; -15.24,2.27 -15.24,1.27 ; -14.24,-1.27 -15.24,-1.27 ; -14.24,1.27 -15.24,1.27 ; -13.7,-1.27 -12.7,-1.27 ; -13.7,1.27 -12.7,1.27 ; -12.7,-2.27 -12.7,-1.27 ; -12.7,-0.27 -12.7,-1.27 ; -12.7,0.27 -12.7,1.27 ; -12.7,2.27 -12.7,1.27 ; -11.7,-1.27 -12.7,-1.27 ; -11.7,1.27 -12.7,1.27 ; -11.16,-1.27 -10.16,-1.27 ; -11.16,1.27 -10.16,1.27 ; -10.16,-2.27 -10.16,-1.27 ; -10.16,-0.27 -10.16,-1.27 ; -10.16,0.27 -10.16,1.27 ; -10.16,2.27 -10.16,1.27 ; -9.16,-1.27 -10.16,-1.27 ; -9.16,1.27 -10.16,1.27 ; -8.62,-1.27 -7.62,-1.27 ; -8.62,1.27 -7.62,1.27 ; -7.62,-2.27 -7.62,-1.27 ; -7.62,-0.27 -7.62,-1.27 ; -7.62,0.27 -7.62,1.27 ; -7.62,2.27 -7.62,1.27 ; -6.62,-1.27 -7.62,-1.27 ; -6.62,1.27 -7.62,1.27 ; -6.08,-1.27 -5.08,-1.27 ; -6.08,1.27 -5.08,1.27 ; -5.08,-2.27 -5.08,-1.27 ; -5.08,-0.27 -5.08,-1.27 ; -5.08,0.27 -5.08,1.27 ; -5.08,2.27 -5.08,1.27 ; -4.08,-1.27 -5.08,-1.27 ; -4.08,1.27 -5.08,1.27 ; -3.54,-1.27 -2.54,-1.27 ; -3.54,1.27 -2.54,1.27 ; -2.54,-2.27 -2.54,-1.27 ; -2.54,-0.27 -2.54,-1.27 ; -2.54,0.27 -2.54,1.27 ; -2.54,2.27 -2.54,1.27 ; -1.54,-1.27 -2.54,-1.27 ; -1.54,1.27 -2.54,1.27 ; -1,-1.27 0,-1.27 ; -1,0 0,0 ; -1,1.27 0,1.27 ; 0,-2.27 0,-1.27 ; 0,-1 0,0 ; 0,-0.27 0,-1.27 ; 0,0.27 0,1.27 ; 0,1 0,0 ; 0,2.27 0,1.27 ; 1,-1.27 0,-1.27 ; 1,0 0,0 ; 1,1.27 0,1.27 ; 1.54,-1.27 2.54,-1.27 ; 1.54,1.27 2.54,1.27 ; 2.54,-2.27 2.54,-1.27 ; 2.54,-0.27 2.54,-1.27 ; 2.54,0.27 2.54,1.27 ; 2.54,2.27 2.54,1.27 ; 3.54,-1.27 2.54,-1.27 ; 3.54,1.27 2.54,1.27 ; 4.08,-1.27 5.08,-1.27 ; 4.08,1.27 5.08,1.27 ; 5.08,-2.27 5.08,-1.27 ; 5.08,-0.27 5.08,-1.27 ; 5.08,0.27 5.08,1.27 ; 5.08,2.27 5.08,1.27 ; 6.08,-1.27 5.08,-1.27 ; 6.08,1.27 5.08,1.27 ; 6.62,-1.27 7.62,-1.27 ; 6.62,1.27 7.62,1.27 ; 7.62,-2.27 7.62,-1.27 ; 7.62,-0.27 7.62,-1.27 ; 7.62,0.27 7.62,1.27 ; 7.62,2.27 7.62,1.27 ; 8.62,-1.27 7.62,-1.27 ; 8.62,1.27 7.62,1.27 ; 9.16,-1.27 10.16,-1.27 ; 9.16,1.27 10.16,1.27 ; 10.16,-2.27 10.16,-1.27 ; 10.16,-0.27 10.16,-1.27 ; 10.16,0.27 10.16,1.27 ; 10.16,2.27 10.16,1.27 ; 11.16,-1.27 10.16,-1.27 ; 11.16,1.27 10.16,1.27 ; 11.7,-1.27 12.7,-1.27 ; 11.7,1.27 12.7,1.27 ; 12.7,-2.27 12.7,-1.27 ; 12.7,-0.27 12.7,-1.27 ; 12.7,0.27 12.7,1.27 ; 12.7,2.27 12.7,1.27 ; 13.7,-1.27 12.7,-1.27 ; 13.7,1.27 12.7,1.27 ; 14.24,-1.27 15.24,-1.27 ; 14.24,1.27 15.24,1.27 ; 15.24,-2.27 15.24,-1.27 ; 15.24,-0.27 15.24,-1.27 ; 15.24,0.27 15.24,1.27 ; 15.24,2.27 15.24,1.27 ; 16.24,-1.27 15.24,-1.27 ; 16.24,1.27 15.24,1.27 ; 16.78,-1.27 17.78,-1.27 ; 16.78,1.27 17.78,1.27 ; 17.78,-2.27 17.78,-1.27 ; 17.78,-0.27 17.78,-1.27 ; 17.78,0.27 17.78,1.27 ; 17.78,2.27 17.78,1.27 ; 18.78,-1.27 17.78,-1.27 ; 18.78,1.27 17.78,1.27 ; 19.32,-1.27 20.32,-1.27 ; 19.32,1.27 20.32,1.27 ; 20.32,-2.27 20.32,-1.27 ; 20.32,-0.27 20.32,-1.27 ; 20.32,0.27 20.32,1.27 ; 20.32,2.27 20.32,1.27 ; 21.32,-1.27 20.32,-1.27 ; 21.32,1.27 20.32,1.27
Mechanical 14:
  lines w0.1: -1.7,-3.05 -1.7,-4.05 1.7,-4.05 1.7,-3.05 ; -23.86,-2.05 ccw(c-22.86,-2.05) -22.86,-3.05 22.84,-3.05 ccw(c22.84,-2.05) 23.84,-2.05 23.84,-1.27 22.84,-1.27 22.84,1.27 23.84,1.27 23.84,2.05 ccw(c22.84,2.05) 22.84,3.05 -22.86,3.05 ccw(c-22.86,2.05) -23.86,2.05 -23.86,1.27 -22.86,1.27 -22.86,-1.27 -23.86,-1.27 ; -23.86,-2.05 -23.86,-1.27 ; -23.86,-2.05 -23.86,-1.27
3D body "3M_9134-4500PL.stp": height 9, standoff -2.8, extent -23.86,-4.05 23.84,3.05

## 3M_9140-4500PL [mm] "40 Contacts - Straight .100\" x .100\" Polarized Boardmount Socket, 9100 Series"
height 9
pads (40):
  round 1.6 hole 0.9: 1(24.13,-1.27) 2(24.13,1.27) 3(21.59,-1.27) 4(21.59,1.27) 5(19.05,-1.27) 6(19.05,1.27) 7(16.51,-1.27) 8(16.51,1.27) 9(13.97,-1.27) 10(13.97,1.27) 11(11.43,-1.27) 12(11.43,1.27) 13(8.89,-1.27) 14(8.89,1.27) 15(6.35,-1.27) 16(6.35,1.27) 17(3.81,-1.27) 18(3.81,1.27) 19(1.27,-1.27) 20(1.27,1.27) 21(-1.27,-1.27) 22(-1.27,1.27) 23(-3.81,-1.27) 24(-3.81,1.27) 25(-6.35,-1.27) 26(-6.35,1.27) 27(-8.89,-1.27) 28(-8.89,1.27) 29(-11.43,-1.27) 30(-11.43,1.27) 31(-13.97,-1.27) 32(-13.97,1.27) 33(-16.51,-1.27) 34(-16.51,1.27) 35(-19.05,-1.27) 36(-19.05,1.27) 37(-21.59,-1.27) 38(-21.59,1.27) 39(-24.13,-1.27) 40(-24.13,1.27)
Top Overlay:
  lines w0.2: -1.69,-3.05 -1.69,-4.05 1.71,-4.05 1.71,-3.05 ; -27.65,-2.05 ccw(c-26.65,-2.05) -26.65,-3.05 26.65,-3.05 ccw(c26.65,-2.05) 27.65,-2.05 27.65,-1.27 26.65,-1.27 26.65,1.27 27.65,1.27 27.65,2.05 ccw(c26.65,2.05) 26.65,3.05 -26.65,3.05 ccw(c-26.65,2.05) -27.65,2.05 -27.65,1.27 -26.65,1.27 -26.65,-1.27 -27.65,-1.27 ; -27.65,-2.05 -27.65,-1.27 ; -27.65,-2.05 -27.65,-1.27
Mechanical 8:
  drawing of 164 lines, arcs and shapes, not listed
Mechanical 14:
  lines w0.1: -1.69,-3.05 -1.69,-4.05 1.71,-4.05 1.71,-3.05 ; -27.65,-2.05 ccw(c-26.65,-2.05) -26.65,-3.05 26.65,-3.05 ccw(c26.65,-2.05) 27.65,-2.05 27.65,-1.27 26.65,-1.27 26.65,1.27 27.65,1.27 27.65,2.05 ccw(c26.65,2.05) 26.65,3.05 -26.65,3.05 ccw(c-26.65,2.05) -27.65,2.05 -27.65,1.27 -26.65,1.27 -26.65,-1.27 -27.65,-1.27 ; -27.65,-2.05 -27.65,-1.27 ; -27.65,-2.05 -27.65,-1.27
3D body "3M_9140-4500PL.stp": height 9, standoff -2.8, extent -27.65,-4.05 27.65,3.05